# Altium footprint library PCB贴片元件封装库.pcblib: 366 footprints (part 3 of 23)
Each footprint in its own frame and in the unit in brackets; x right, y up, seen from the top. Pads: shape width x height; smd on the part's side, far side on the other; paste and mask are expansions set on the pad; w line width, h text height; cw(c..) or ccw(c..) is an arc to the next point about the centre after c.
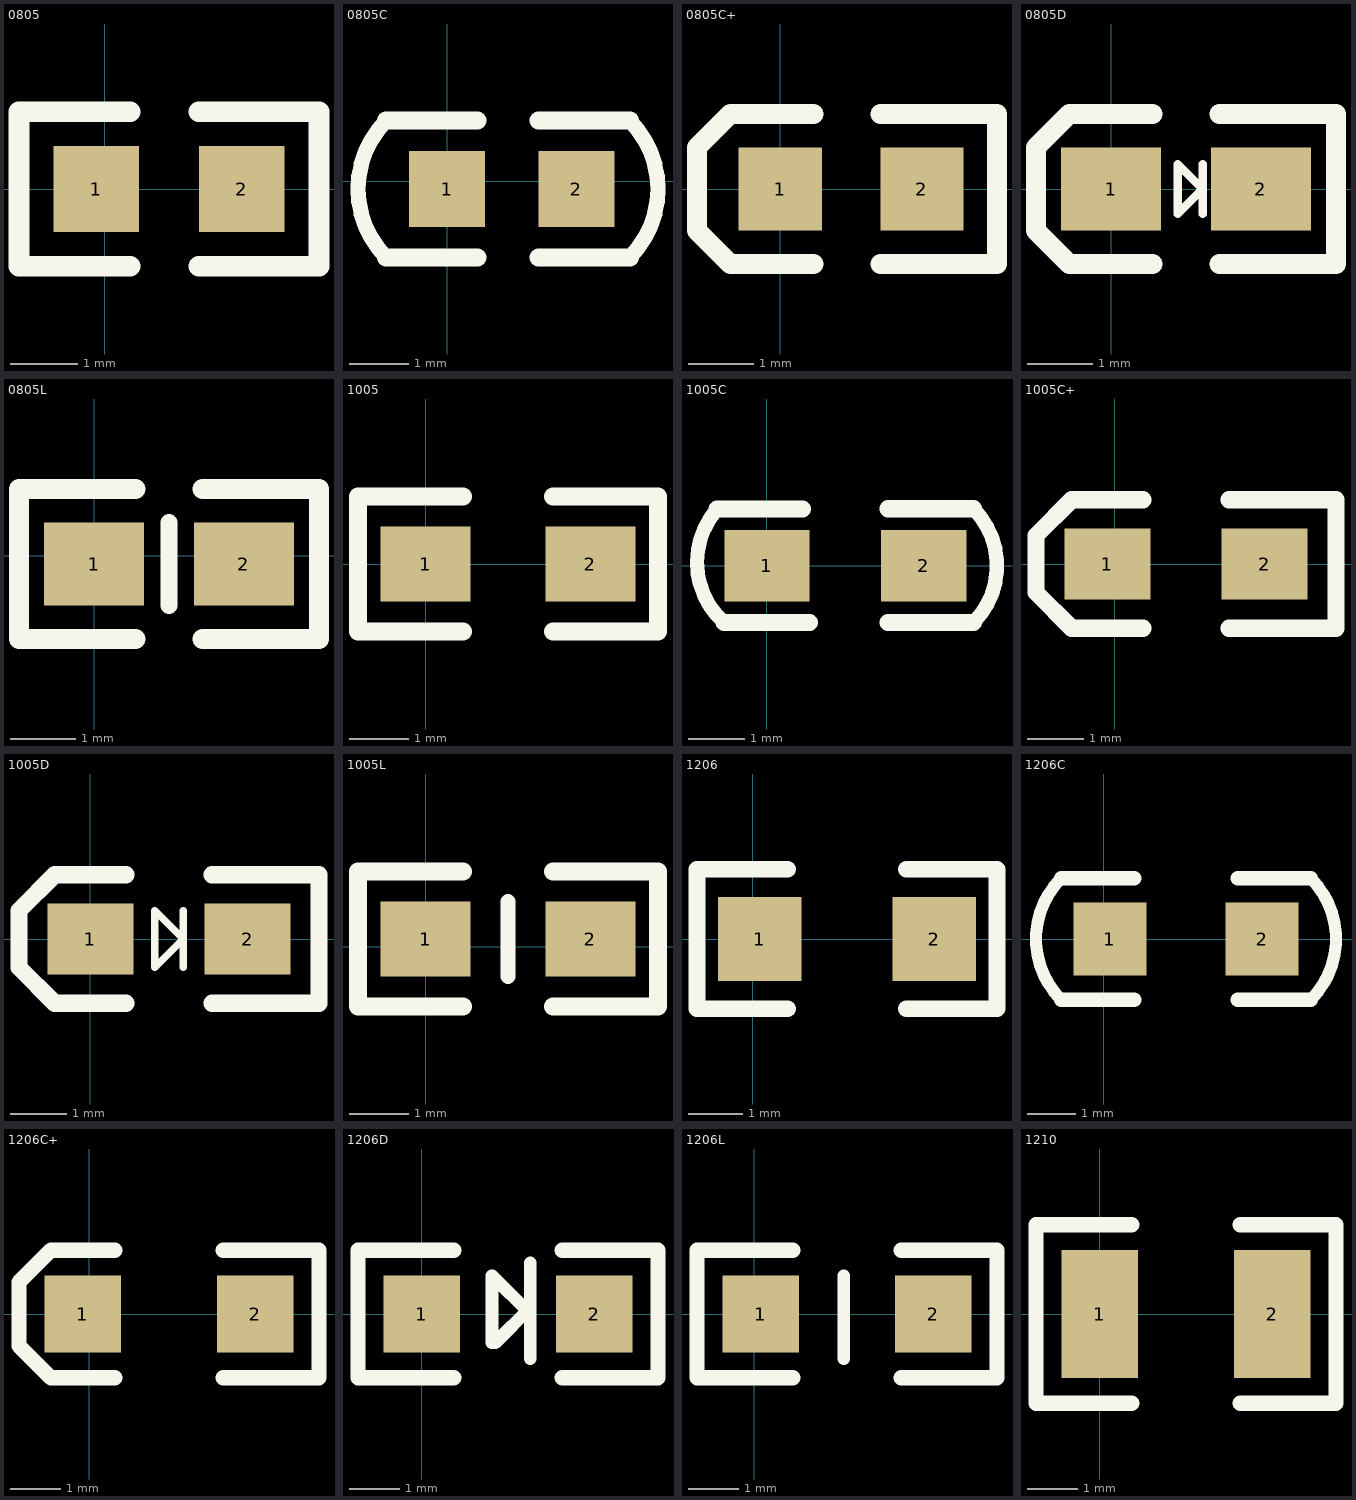
[diagram p2: the footprints below, top view; thin cyan lines are the x and y axes]

## 0805 [mil]
pads (2):
  rect 50x50 smd: 1(-5,0) 2(80,0)
TopOverlay:
  lines w12: 15,-45 -50,-45 -50,45 15,45 ; 55,-45 125,-45 125,45 55,45

## 0805C [mil]
pads (2):
  rect 50x50 smd: 1(0,-5) 2(85,-5)
TopOverlay:
  lines w10: -40,-50 cw(c5,-5) -40,40 ; 120,-50 ccw(c75,-5) 120,40
  lines w12: -40,-50 20,-50 ; -40,40 20,40 ; 60,-50 120,-50 ; 60,40 120,40

## 0805C+ [mil]
pads (2):
  rect 50x50 smd: 1(0,0) 2(85,0)
TopOverlay:
  lines w12: 20,-45 -30,-45 -50,-25 -50,25 -30,45 20,45 ; 60,-45 130,-45 130,45 60,45

## 0805D [mil]
pads (2):
  rect 60x50 smd: 1(0,0) 2(90,0)
TopOverlay:
  lines w5: 55,-15 55,15 ; 40,-15 40,15 55,0 40,-15
  lines w12: 25,-45 -25,-45 -45,-25 -45,25 -25,45 25,45 ; 65,-45 135,-45 135,45 65,45

## 0805L [mil]
pads (2):
  rect 60x50 smd: 1(0,-5) 2(90,-5)
TopOverlay:
  lines w10: 45,-30 45,20
  lines w12: 25,-50 -45,-50 -45,40 25,40 ; 65,-50 135,-50 135,40 65,40

## 1005 [mil]
pads (2):
  rect 60x50 smd: 1(0,0) 2(110,0)
TopOverlay:
  lines w12: 25,-45 -45,-45 -45,45 25,45 ; 85,-45 155,-45 155,45 85,45

## 1005C [mil]
pads (2):
  rect 60x50 smd: 1(0,0) 2(110,0)
TopOverlay:
  lines w10: -35,39.85 ccw(c7.43,2.43) -30,-40 ; 145,-40 ccw(c105,0) 145,40
  lines w12: -35,39.85 25,39.85 ; -30,-40 30,-40 ; 85,-40 145,-40 ; 85,40 145,40

## 1005C+ [mil]
pads (2):
  rect 60x50 smd: 1(-5,0) 2(105,0)
TopOverlay:
  lines w12: 20,-45 -30,-45 -55,-20 -55,20 -30,45 20,45 ; 80,-45 155,-45 155,45 80,45

## 1005D [mil]
pads (2):
  rect 60x50 smd: 1(0,0) 2(110,0)
TopOverlay:
  lines w5: 65,-20 65,20 ; 45,-20 45,20 65,0 45,-20
  lines w12: 25,-45 -25,-45 -50,-20 -50,20 -25,45 25,45 ; 85,-45 160,-45 160,45 85,45

## 1005L [mil]
pads (2):
  rect 60x50 smd: 1(0,5) 2(110,5)
TopOverlay:
  lines w10: 55,-20 55,30
  lines w12: 25,-40 -45,-40 -45,50 25,50 ; 85,-40 155,-40 155,50 85,50

## 1206 [mil]
pads (2):
  rect 60x60 smd: 1(5,0) 2(130,0)
TopOverlay:
  lines w12: 25,-50 -40,-50 -40,50 25,50 ; 110,-50 175,-50 175,50 110,50

## 1206C [mil]
pads (2):
  rect 60x60 smd: 1(5,0) 2(130,0)
TopOverlay:
  lines w10: -35,-50 cw(c15,0) -35,50 ; 170,-50 ccw(c120,0) 170,50
  lines w12: -35,-50 25,-50 ; -35,50 25,50 ; 110,-50 170,-50 ; 110,50 170,50

## 1206C+ [mil]
pads (2):
  rect 60x60 smd: 1(-5,0) 2(130,0)
TopOverlay:
  lines w12: 20,-50 -30,-50 -55,-25 -55,25 -30,50 20,50 ; 105,-50 180,-50 180,50 105,50

## 1206D [mil]
pads (2):
  rect 60x60 smd: 1(0,0) 2(135,0)
TopOverlay:
  lines w10: 55,-22.5 55,30 85,0 ; 57.5,-22.5 85,5 ; 85,-35 85,40
  lines w12: 25,-50 -50,-50 -50,50 25,50 ; 110,-50 185,-50 185,50 110,50

## 1206L [mil]
pads (2):
  rect 60x60 smd: 1(5,0) 2(140,0)
TopOverlay:
  lines w10: 70,-35 70,30
  lines w12: 30,-50 -45,-50 -45,50 30,50 ; 115,-50 190,-50 190,50 115,50

## 1210 [mil]
pads (2):
  rect 60x100 smd: 1(0,0) 2(135,0)
TopOverlay:
  lines w12: 25,-70 -50,-70 -50,70 25,70 ; 110,-70 185,-70 185,70 110,70